# Altium footprint library General_Lib.PcbLib: 729 footprints (part 12 of 46)
Each footprint in its own frame and in the unit in brackets; x right, y up, seen from the top. Pads: shape width x height; smd on the part's side, far side on the other; paste and mask are expansions set on the pad; w line width, h text height; cw(c..) or ccw(c..) is an arc to the next point about the centre after c.
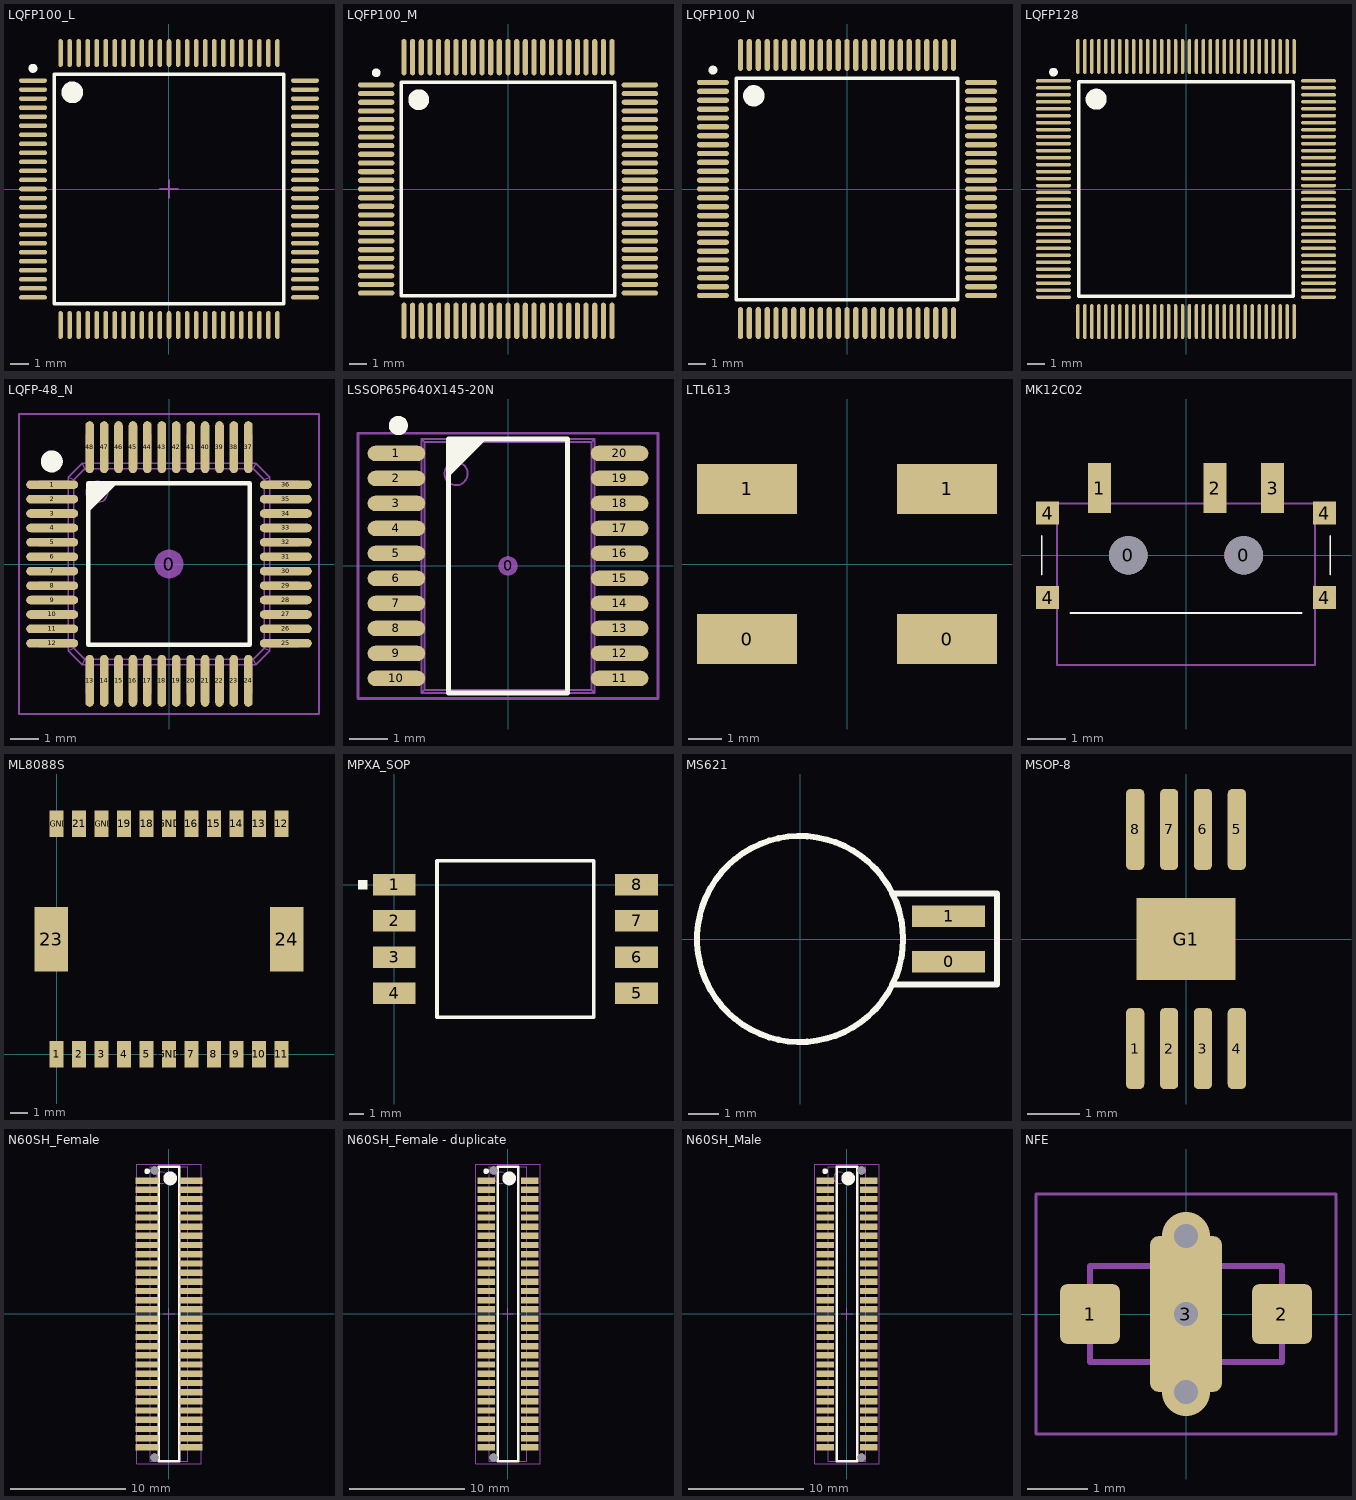
[diagram p11: the footprints below, top view; thin cyan lines are the x and y axes]

## LQFP100_L [mm] "Thin QFP, 100-Leads, Body 14x14mm, Pitch 0.5mm, IPC High Density"
height 1.6
pads (100):
  oval 1.55x0.25 smd: 1(-7.525,6) 2(-7.525,5.5) 3(-7.525,5) 4(-7.525,4.5) 5(-7.525,4) 6(-7.525,3.5) 7(-7.525,3) 8(-7.525,2.5) 9(-7.525,2) 10(-7.525,1.5) 11(-7.525,1) 12(-7.525,0.5) 13(-7.525,0) 14(-7.525,-0.5) 15(-7.525,-1) 16(-7.525,-1.5) 17(-7.525,-2) 18(-7.525,-2.5) 19(-7.525,-3) 20(-7.525,-3.5) 21(-7.525,-4) 22(-7.525,-4.5) 23(-7.525,-5) 24(-7.525,-5.5) 25(-7.525,-6) 51(7.525,-6) 52(7.525,-5.5) 53(7.525,-5) 54(7.525,-4.5) 55(7.525,-4) 56(7.525,-3.5) 57(7.525,-3) 58(7.525,-2.5) 59(7.525,-2) 60(7.525,-1.5) 61(7.525,-1) 62(7.525,-0.5) 63(7.525,0) 64(7.525,0.5) 65(7.525,1) 66(7.525,1.5) 67(7.525,2) 68(7.525,2.5) 69(7.525,3) 70(7.525,3.5) 71(7.525,4) 72(7.525,4.5) 73(7.525,5) 74(7.525,5.5) 75(7.525,6)
  oval 0.25x1.55 smd: 26(-6,-7.525) 27(-5.5,-7.525) 28(-5,-7.525) 29(-4.5,-7.525) 30(-4,-7.525) 31(-3.5,-7.525) 32(-3,-7.525) 33(-2.5,-7.525) 34(-2,-7.525) 35(-1.5,-7.525) 36(-1,-7.525) 37(-0.5,-7.525) 38(0,-7.525) 39(0.5,-7.525) 40(1,-7.525) 41(1.5,-7.525) 42(2,-7.525) 43(2.5,-7.525) 44(3,-7.525) 45(3.5,-7.525) 46(4,-7.525) 47(4.5,-7.525) 48(5,-7.525) 49(5.5,-7.525) 50(6,-7.525) 76(6,7.525) 77(5.5,7.525) 78(5,7.525) 79(4.5,7.525) 80(4,7.525) 81(3.5,7.525) 82(3,7.525) 83(2.5,7.525) 84(2,7.525) 85(1.5,7.525) 86(1,7.525) 87(0.5,7.525) 88(0,7.525) 89(-0.5,7.525) 90(-1,7.525) 91(-1.5,7.525) 92(-2,7.525) 93(-2.5,7.525) 94(-3,7.525) 95(-3.5,7.525) 96(-4,7.525) 97(-4.5,7.525) 98(-5,7.525) 99(-5.5,7.525) 100(-6,7.525)
Top Overlay:
  circle w0.25: c-7.525,6.675 r0.125
  circle w0.6: c-5.35,5.35 r0.3
  lines w0.2: -6.35,-6.35 -6.35,6.35 6.35,6.35 6.35,-6.35 -6.35,-6.35
Mechanical 15:
  lines w0.1: -0.5,0 0.5,0 ; 0,-0.5 0,0.5
3D body "LQFP-100.step": height 1.7, standoff -0.01, extent -8,-8 8,8

## LQFP100_M [mm] "Thin QFP, 100-Leads, Body 14x14mm, Pitch 0.5mm, IPC Low Density"
height 1.6
pads (100):
  oval 2.1x0.3 smd: 1(-7.6,6) 2(-7.6,5.5) 3(-7.6,5) 4(-7.6,4.5) 5(-7.6,4) 6(-7.6,3.5) 7(-7.6,3) 8(-7.6,2.5) 9(-7.6,2) 10(-7.6,1.5) 11(-7.6,1) 12(-7.6,0.5) 13(-7.6,0) 14(-7.6,-0.5) 15(-7.6,-1) 16(-7.6,-1.5) 17(-7.6,-2) 18(-7.6,-2.5) 19(-7.6,-3) 20(-7.6,-3.5) 21(-7.6,-4) 22(-7.6,-4.5) 23(-7.6,-5) 24(-7.6,-5.5) 25(-7.6,-6) 51(7.6,-6) 52(7.6,-5.5) 53(7.6,-5) 54(7.6,-4.5) 55(7.6,-4) 56(7.6,-3.5) 57(7.6,-3) 58(7.6,-2.5) 59(7.6,-2) 60(7.6,-1.5) 61(7.6,-1) 62(7.6,-0.5) 63(7.6,0) 64(7.6,0.5) 65(7.6,1) 66(7.6,1.5) 67(7.6,2) 68(7.6,2.5) 69(7.6,3) 70(7.6,3.5) 71(7.6,4) 72(7.6,4.5) 73(7.6,5) 74(7.6,5.5) 75(7.6,6)
  oval 0.3x2.1 smd: 26(-6,-7.6) 27(-5.5,-7.6) 28(-5,-7.6) 29(-4.5,-7.6) 30(-4,-7.6) 31(-3.5,-7.6) 32(-3,-7.6) 33(-2.5,-7.6) 34(-2,-7.6) 35(-1.5,-7.6) 36(-1,-7.6) 37(-0.5,-7.6) 38(0,-7.6) 39(0.5,-7.6) 40(1,-7.6) 41(1.5,-7.6) 42(2,-7.6) 43(2.5,-7.6) 44(3,-7.6) 45(3.5,-7.6) 46(4,-7.6) 47(4.5,-7.6) 48(5,-7.6) 49(5.5,-7.6) 50(6,-7.6) 76(6,7.6) 77(5.5,7.6) 78(5,7.6) 79(4.5,7.6) 80(4,7.6) 81(3.5,7.6) 82(3,7.6) 83(2.5,7.6) 84(2,7.6) 85(1.5,7.6) 86(1,7.6) 87(0.5,7.6) 88(0,7.6) 89(-0.5,7.6) 90(-1,7.6) 91(-1.5,7.6) 92(-2,7.6) 93(-2.5,7.6) 94(-3,7.6) 95(-3.5,7.6) 96(-4,7.6) 97(-4.5,7.6) 98(-5,7.6) 99(-5.5,7.6) 100(-6,7.6)
Top Overlay:
  circle w0.25: c-7.6,6.7 r0.125
  circle w0.6: c-5.15,5.15 r0.3
  lines w0.2: -6.15,-6.15 -6.15,6.15 6.15,6.15 6.15,-6.15 -6.15,-6.15
3D body "LQFP-100.step": height 1.7, standoff -0.01, extent -8,-8 8,8

## LQFP100_N [mm] "Thin QFP, 100-Leads, Body 14x14mm, Pitch 0.5mm, IPC Medium Density"
height 1.6
pads (100):
  oval 1.8x0.3 smd: 1(-7.55,6) 2(-7.55,5.5) 3(-7.55,5) 4(-7.55,4.5) 5(-7.55,4) 6(-7.55,3.5) 7(-7.55,3) 8(-7.55,2.5) 9(-7.55,2) 10(-7.55,1.5) 11(-7.55,1) 12(-7.55,0.5) 13(-7.55,0) 14(-7.55,-0.5) 15(-7.55,-1) 16(-7.55,-1.5) 17(-7.55,-2) 18(-7.55,-2.5) 19(-7.55,-3) 20(-7.55,-3.5) 21(-7.55,-4) 22(-7.55,-4.5) 23(-7.55,-5) 24(-7.55,-5.5) 25(-7.55,-6) 51(7.55,-6) 52(7.55,-5.5) 53(7.55,-5) 54(7.55,-4.5) 55(7.55,-4) 56(7.55,-3.5) 57(7.55,-3) 58(7.55,-2.5) 59(7.55,-2) 60(7.55,-1.5) 61(7.55,-1) 62(7.55,-0.5) 63(7.55,0) 64(7.55,0.5) 65(7.55,1) 66(7.55,1.5) 67(7.55,2) 68(7.55,2.5) 69(7.55,3) 70(7.55,3.5) 71(7.55,4) 72(7.55,4.5) 73(7.55,5) 74(7.55,5.5) 75(7.55,6)
  oval 0.3x1.8 smd: 26(-6,-7.55) 27(-5.5,-7.55) 28(-5,-7.55) 29(-4.5,-7.55) 30(-4,-7.55) 31(-3.5,-7.55) 32(-3,-7.55) 33(-2.5,-7.55) 34(-2,-7.55) 35(-1.5,-7.55) 36(-1,-7.55) 37(-0.5,-7.55) 38(0,-7.55) 39(0.5,-7.55) 40(1,-7.55) 41(1.5,-7.55) 42(2,-7.55) 43(2.5,-7.55) 44(3,-7.55) 45(3.5,-7.55) 46(4,-7.55) 47(4.5,-7.55) 48(5,-7.55) 49(5.5,-7.55) 50(6,-7.55) 76(6,7.55) 77(5.5,7.55) 78(5,7.55) 79(4.5,7.55) 80(4,7.55) 81(3.5,7.55) 82(3,7.55) 83(2.5,7.55) 84(2,7.55) 85(1.5,7.55) 86(1,7.55) 87(0.5,7.55) 88(0,7.55) 89(-0.5,7.55) 90(-1,7.55) 91(-1.5,7.55) 92(-2,7.55) 93(-2.5,7.55) 94(-3,7.55) 95(-3.5,7.55) 96(-4,7.55) 97(-4.5,7.55) 98(-5,7.55) 99(-5.5,7.55) 100(-6,7.55)
Top Overlay:
  circle w0.25: c-7.55,6.7 r0.125
  circle w0.6: c-5.25,5.25 r0.3
  lines w0.2: -6.25,-6.25 -6.25,6.25 6.25,6.25 6.25,-6.25 -6.25,-6.25
3D body "LQFP-100.step": height 1.7, standoff -0.01, extent -8,-8 8,8

## LQFP128 [mm] "Thin QFP, 128Leads, Body 14x14mm, Pitch 0.4mm, IPC Low Density"
height 1.6
pads (128):
  oval 2x0.2 smd: 1(-7.6,6.2) 2(-7.6,5.8) 3(-7.6,5.4) 4(-7.6,5) 5(-7.6,4.6) 6(-7.6,4.2) 7(-7.6,3.8) 8(-7.6,3.4) 9(-7.6,3) 10(-7.6,2.6) 11(-7.6,2.2) 12(-7.6,1.8) 13(-7.6,1.4) 14(-7.6,1) 15(-7.6,0.6) 16(-7.6,0.2) 17(-7.6,-0.2) 18(-7.6,-0.6) 19(-7.6,-1) 20(-7.6,-1.4) 21(-7.6,-1.8) 22(-7.6,-2.2) 23(-7.6,-2.6) 24(-7.6,-3) 25(-7.6,-3.4) 26(-7.6,-3.8) 27(-7.6,-4.2) 28(-7.6,-4.6) 29(-7.6,-5) 30(-7.6,-5.4) 31(-7.6,-5.8) 32(-7.6,-6.2) 65(7.6,-6.2) 66(7.6,-5.8) 67(7.6,-5.4) 68(7.6,-5) 69(7.6,-4.6) 70(7.6,-4.2) 71(7.6,-3.8) 72(7.6,-3.4) 73(7.6,-3) 74(7.6,-2.6) 75(7.6,-2.2) 76(7.6,-1.8) 77(7.6,-1.4) 78(7.6,-1) 79(7.6,-0.6) 80(7.6,-0.2) 81(7.6,0.2) 82(7.6,0.6) 83(7.6,1) 84(7.6,1.4) 85(7.6,1.8) 86(7.6,2.2) 87(7.6,2.6) 88(7.6,3) 89(7.6,3.4) 90(7.6,3.8) 91(7.6,4.2) 92(7.6,4.6) 93(7.6,5) 94(7.6,5.4) 95(7.6,5.8) 96(7.6,6.2)
  oval 0.2x2 smd: 33(-6.2,-7.6) 34(-5.8,-7.6) 35(-5.4,-7.6) 36(-5,-7.6) 37(-4.6,-7.6) 38(-4.2,-7.6) 39(-3.8,-7.6) 40(-3.4,-7.6) 41(-3,-7.6) 42(-2.6,-7.6) 43(-2.2,-7.6) 44(-1.8,-7.6) 45(-1.4,-7.6) 46(-1,-7.6) 47(-0.6,-7.6) 48(-0.2,-7.6) 49(0.2,-7.6) 50(0.6,-7.6) 51(1,-7.6) 52(1.4,-7.6) 53(1.8,-7.6) 54(2.2,-7.6) 55(2.6,-7.6) 56(3,-7.6) 57(3.4,-7.6) 58(3.8,-7.6) 59(4.2,-7.6) 60(4.6,-7.6) 61(5,-7.6) 62(5.4,-7.6) 63(5.8,-7.6) 64(6.2,-7.6) 97(6.2,7.6) 98(5.8,7.6) 99(5.4,7.6) 100(5,7.6) 101(4.6,7.6) 102(4.2,7.6) 103(3.8,7.6) 104(3.4,7.6) 105(3,7.6) 106(2.6,7.6) 107(2.2,7.6) 108(1.8,7.6) 109(1.4,7.6) 110(1,7.6) 111(0.6,7.6) 112(0.2,7.6) 113(-0.2,7.6) 114(-0.6,7.6) 115(-1,7.6) 116(-1.4,7.6) 117(-1.8,7.6) 118(-2.2,7.6) 119(-2.6,7.6) 120(-3,7.6) 121(-3.4,7.6) 122(-3.8,7.6) 123(-4.2,7.6) 124(-4.6,7.6) 125(-5,7.6) 126(-5.4,7.6) 127(-5.8,7.6) 128(-6.2,7.6)
Top Overlay:
  circle w0.6: c-5.15,5.15 r0.3
  circle w0.25: c-7.6,6.7 r0.125
  lines w0.2: -6.15,-6.15 6.15,-6.15 6.15,6.15 -6.15,6.15 -6.15,-6.15
3D body "LQFP-128.step": height 1.35, standoff 0, extent -8,-8 8,8

## LQFP-48_N [mm] "Thin QFP, 48-Leads, Body 7x7mm, Pitch 0.5mm, IPC Medium Density"
height 1.6
pads (49):
  round 1 on Mech15: 0(0,0)
  oval 1.8x0.3 smd: 1(-4.05,2.75) 2(-4.05,2.25) 3(-4.05,1.75) 4(-4.05,1.25) 5(-4.05,0.75) 6(-4.05,0.25) 7(-4.05,-0.25) 8(-4.05,-0.75) 9(-4.05,-1.25) 10(-4.05,-1.75) 11(-4.05,-2.25) 12(-4.05,-2.75) 25(4.05,-2.75) 26(4.05,-2.25) 27(4.05,-1.75) 28(4.05,-1.25) 29(4.05,-0.75) 30(4.05,-0.25) 31(4.05,0.25) 32(4.05,0.75) 33(4.05,1.25) 34(4.05,1.75) 35(4.05,2.25) 36(4.05,2.75)
  oval 0.3x1.8 smd: 13(-2.75,-4.05) 14(-2.25,-4.05) 15(-1.75,-4.05) 16(-1.25,-4.05) 17(-0.75,-4.05) 18(-0.25,-4.05) 19(0.25,-4.05) 20(0.75,-4.05) 21(1.25,-4.05) 22(1.75,-4.05) 23(2.25,-4.05) 24(2.75,-4.05) 37(2.75,4.05) 38(2.25,4.05) 39(1.75,4.05) 40(1.25,4.05) 41(0.75,4.05) 42(0.25,4.05) 43(-0.25,4.05) 44(-0.75,4.05) 45(-1.25,4.05) 46(-1.75,4.05) 47(-2.25,4.05) 48(-2.75,4.05)
Top Overlay:
  circle w0.381: c-4.064,3.556 r0.191
  region: -2.794,2.794 -1.794,2.794 -2.794,1.794
  lines w0.152: -2.794,-2.794 -2.794,2.794 2.794,2.794 2.794,-2.794 -2.794,-2.794
Mechanical 13:
  drawing of 361 lines, arcs and shapes, not listed
Mechanical 15:
  lines w0.076: -5.2,-5.2 -5.2,5.2 5.2,5.2 5.2,-5.2 -5.2,-5.2
3D body "LQFP-48.STEP": height 1.59, standoff -0.01, extent -4.5,-4.5 4.5,4.5

## LSSOP65P640X145-20N [mm] "LSSOP, 20-Leads, Body 6.6x4.5mm (max), Pitch 0.65mm, IPC Medium Density"
height 1.45
pads (21):
  round 0.508 on Mech15 mask+0.127: 0(0,0)
  oval 1.5x0.4 smd paste-1 mask+0.127: 1(-2.9,2.925) 2(-2.9,2.275) 3(-2.9,1.625) 4(-2.9,0.975) 5(-2.9,0.325) 6(-2.9,-0.325) 7(-2.9,-0.975) 8(-2.9,-1.625) 9(-2.9,-2.275) 10(-2.9,-2.925) 11(2.9,-2.925) 12(2.9,-2.275) 13(2.9,-1.625) 14(2.9,-0.975) 15(2.9,-0.325) 16(2.9,0.325) 17(2.9,0.975) 18(2.9,1.625) 19(2.9,2.275) 20(2.9,2.925)
Top Overlay:
  circle w0.25: c-2.85,3.65 r0.125
  region: -1.55,3.3 -0.55,3.3 -1.55,2.3
  lines w0.127: -1.55,-3.3 1.55,-3.3 1.55,3.3 -1.55,3.3 -1.55,-3.3
Top Paste:
  region: 3.5,-2.775 2.3,-2.775 2.3,-3.075 3.5,-3.075
  region: 3.5,-2.125 2.3,-2.125 2.3,-2.425 3.5,-2.425
  region: 3.5,-1.475 2.3,-1.475 2.3,-1.775 3.5,-1.775
  rectangle: -3.5,-1.775 -2.3,-1.475
  rectangle: -3.5,-2.425 -2.3,-2.125
  rectangle: -3.5,-3.075 -2.3,-2.775
  rectangle: -3.5,-1.125 -2.3,-0.825
  rectangle: -3.5,-0.475 -2.3,-0.175
  rectangle: -3.5,0.175 -2.3,0.475
  rectangle: -3.5,0.825 -2.3,1.125
  rectangle: -3.5,1.475 -2.3,1.775
  rectangle: -3.5,2.125 -2.3,2.425
  rectangle: -3.5,2.775 -2.3,3.075
  region: 3.5,3.075 2.3,3.075 2.3,2.775 3.5,2.775
  region: 3.5,2.425 2.3,2.425 2.3,2.125 3.5,2.125
  region: 3.5,1.775 2.3,1.775 2.3,1.475 3.5,1.475
  region: 3.5,1.125 2.3,1.125 2.3,0.825 3.5,0.825
  region: 3.5,0.475 2.3,0.475 2.3,0.175 3.5,0.175
  region: 3.5,-0.175 2.3,-0.175 2.3,-0.475 3.5,-0.475
  region: 3.5,-0.825 2.3,-0.825 2.3,-1.125 3.5,-1.125
Mechanical 13:
  drawing of 153 lines, arcs and shapes, not listed
Mechanical 15:
  lines w0.076: -3.9,-3.45 3.9,-3.45 3.9,3.45 -3.9,3.45 -3.9,-3.45
3D body "LSSOP65P640X145-20N.STEP": height 1.45, standoff 0, extent -3.3,-3.3 3.3,3.3

## LTL613 [mm]
pads (4):
  rect 3x1.5 smd: 0(-3,-2.25) 0(3,-2.25) 1(-3,2.25) 1(3,2.25)
3D body "LTL613.stp": height 5, standoff 0, extent -4.039,-3 4.039,3

## MK12C02 [mm]
pads (9):
  round 1 hole 1 unplated: 0(-1.5,0) 0(1.5,0)
  rect 0.6x1.3 smd: 1(-2.25,1.75) 2(0.75,1.75) 3(2.25,1.75)
  rect 0.6x0.6 smd: 4(-3.6,-1.1) 4(-3.6,1.1) 4(3.6,-1.1) 4(3.6,1.1)
Top Overlay:
  lines w0.05: -3.75,-0.5 -3.75,0.5 ; -3,-1.5 3,-1.5 ; 3.75,-0.5 3.75,0.5
Mechanical 3:
  lines w0.05: -3.35,-2.85 3.35,-2.85 3.35,1.35 -3.35,1.35 -3.35,-2.85

## ML8088S [mm]
pads (24):
  rect 0.8x1.5 smd: 1(0,0) 2(1.27,0) 3(2.54,0) 4(3.81,0) 5(5.08,0) 7(7.62,0) 8(8.89,0) 9(10.16,0) 10(11.43,0) 11(12.7,0) 12(12.7,13) 13(11.43,13) 14(10.16,13) 15(8.89,13) 16(7.62,13) 18(5.08,13) 19(3.81,13) 21(1.27,13) AGND(0,13) AGND(2.54,13) GND(6.35,0) GND(6.35,13)
  rect 1.9x3.65 smd: 23(-0.3,6.495) 24(13,6.495)
3D body "ML8088S.stp": height 2.85, standoff 0, extent -1.15,0 13.85,13

## MPXA_SOP [mm]
pads (8):
  rect 3x1.5 smd: 1(0,0) 2(0,-2.54) 3(0,-5.08) 4(0,-7.62) 5(17,-7.62) 6(17,-5.08) 7(17,-2.54) 8(17,0)
Top Overlay:
  region: -2.54,-0.318 -1.905,-0.318 -1.905,0.318 -2.54,0.318
  lines w0.254: 3,-9.31 14,-9.31 14,1.69 3,1.69 3,-9.31
3D body "humidity sensor.stp": height 5.82, standoff -0.03, extent -0.963,-9.15 17.813,1.55

## MS621 [mm] "Micro Li-ion rechargable battery"
pads (2):
  rect 2.4x0.7 smd: 0(4.9,-0.75) 1(4.9,0.75)
Top Overlay:
  circle w0.2: c0,0 r3.4
  lines w0.2: 3.1,-1.5 6.5,-1.5 6.5,1.5 3.1,1.5
3D body "MS621_batt.stp": height 2.4, standoff 0, extent -3.4,-3.4 5.9,3.4

## MSOP-8 [mm]
pads (9):
  rrect50% 0.35x1.55 smd: 1(-0.975,-2.1) 2(-0.325,-2.1) 3(0.325,-2.1) 4(0.975,-2.1) 5(0.975,2.1) 6(0.325,2.1) 7(-0.325,2.1) 8(-0.975,2.1)
  rect 1.89x1.57 smd: G1(0,0)
3D body "MSOP-8.step": height 1.09, standoff -0.01, extent -1.5,-2.5 1.5,2.5

## N60SH_Female [mm] "Netus, 60-Leads, Body 25,6x3,3mm (max), Pitch 0,80mm, IPC Medium Density"
height 3.55
pads (60):
  rect 2x0.55 smd: 1(-1.9,11.6) 2(1.9,11.6) 3(-1.9,10.8) 4(1.9,10.8) 5(-1.9,10) 6(1.9,10) 7(-1.9,9.2) 8(1.9,9.2) 9(-1.9,8.4) 10(1.9,8.4) 11(-1.9,7.6) 12(1.9,7.6) 13(-1.9,6.8) 14(1.9,6.8) 15(-1.9,6) 16(1.9,6) 17(-1.9,5.2) 18(1.9,5.2) 19(-1.9,4.4) 20(1.9,4.4) 21(-1.9,3.6) 22(1.9,3.6) 23(-1.9,2.8) 24(1.9,2.8) 25(-1.9,2) 26(1.9,2) 27(-1.9,1.2) 28(1.9,1.2) 29(-1.9,0.4) 30(1.9,0.4) 31(-1.9,-0.4) 32(1.9,-0.4) 33(-1.9,-1.2) 34(1.9,-1.2) 35(-1.9,-2) 36(1.9,-2) 37(-1.9,-2.8) 38(1.9,-2.8) 39(-1.9,-3.6) 40(1.9,-3.6) 41(-1.9,-4.4) 42(1.9,-4.4) 43(-1.9,-5.2) 44(1.9,-5.2) 45(-1.9,-6) 46(1.9,-6) 47(-1.9,-6.8) 48(1.9,-6.8) 49(-1.9,-7.6) 50(1.9,-7.6) 51(-1.9,-8.4) 52(1.9,-8.4) 53(-1.9,-9.2) 54(1.9,-9.2) 55(-1.9,-10) 56(1.9,-10) 57(-1.9,-10.8) 58(1.9,-10.8) 59(-1.9,-11.6) 60(1.9,-11.6)
via -1.25,12.5 diameter 0.7 hole 0.7
via -1.25,-12.5 diameter 0.7 hole 0.7
Top Overlay:
  circle w0.25: c-1.9,12.425 r0.125
  circle w0.6: c0.1,11.8 r0.3
  lines w0.2: -0.9,-12.8 -0.9,12.8 0.9,12.8 0.9,-12.8 -0.9,-12.8
Mechanical 13:
  circle w0.1: c-0.675,11.85 r0.5
  lines w0.1: -1.625,-12.8 -1.625,12.8 1.625,12.8 1.625,-12.8 -1.625,-12.8
Mechanical 15:
  lines w0.1: -0.5,0 0.5,0 ; 0,-0.5 0,0.5 ; -2.8,-13.05 -2.8,13.05 2.8,13.05 2.8,-13.05 -2.8,-13.05
3D body: height 3.55, standoff 0.1, extent -1.625,-12.8 1.625,12.8

## N60SH_Female - duplicate [mm] "Netus, 60-Leads, Body 25,6x3,3mm (max), Pitch 0,80mm, IPC Medium Density"
height 3.55
pads (60):
  rect 1.5x0.55 smd: 1(-1.9,11.6) 2(1.9,11.6) 3(-1.9,10.8) 4(1.9,10.8) 5(-1.9,10) 6(1.9,10) 7(-1.9,9.2) 8(1.9,9.2) 9(-1.9,8.4) 10(1.9,8.4) 11(-1.9,7.6) 12(1.9,7.6) 13(-1.9,6.8) 14(1.9,6.8) 15(-1.9,6) 16(1.9,6) 17(-1.9,5.2) 18(1.9,5.2) 19(-1.9,4.4) 20(1.9,4.4) 21(-1.9,3.6) 22(1.9,3.6) 23(-1.9,2.8) 24(1.9,2.8) 25(-1.9,2) 26(1.9,2) 27(-1.9,1.2) 28(1.9,1.2) 29(-1.9,0.4) 30(1.9,0.4) 31(-1.9,-0.4) 32(1.9,-0.4) 33(-1.9,-1.2) 34(1.9,-1.2) 35(-1.9,-2) 36(1.9,-2) 37(-1.9,-2.8) 38(1.9,-2.8) 39(-1.9,-3.6) 40(1.9,-3.6) 41(-1.9,-4.4) 42(1.9,-4.4) 43(-1.9,-5.2) 44(1.9,-5.2) 45(-1.9,-6) 46(1.9,-6) 47(-1.9,-6.8) 48(1.9,-6.8) 49(-1.9,-7.6) 50(1.9,-7.6) 51(-1.9,-8.4) 52(1.9,-8.4) 53(-1.9,-9.2) 54(1.9,-9.2) 55(-1.9,-10) 56(1.9,-10) 57(-1.9,-10.8) 58(1.9,-10.8) 59(-1.9,-11.6) 60(1.9,-11.6)
via -1.25,12.5 diameter 0.7 hole 0.7
via -1.25,-12.5 diameter 0.7 hole 0.7
Top Overlay:
  circle w0.25: c-1.9,12.425 r0.125
  circle w0.6: c0.1,11.8 r0.3
  lines w0.2: -0.9,-12.8 -0.9,12.8 0.9,12.8 0.9,-12.8 -0.9,-12.8
Mechanical 13:
  circle w0.1: c-0.675,11.85 r0.5
  lines w0.1: -1.625,-12.8 -1.625,12.8 1.625,12.8 1.625,-12.8 -1.625,-12.8
Mechanical 15:
  lines w0.1: -0.5,0 0.5,0 ; 0,-0.5 0,0.5 ; -2.8,-13.05 -2.8,13.05 2.8,13.05 2.8,-13.05 -2.8,-13.05
3D body: height 3.55, standoff 0.1, extent -1.625,-12.8 1.625,12.8

## N60SH_Male [mm] "Netus, 60-Leads, Body 25,6x3,3mm (max), Pitch 0,80mm, IPC Medium Density"
height 3.55
pads (60):
  rect 1.5x0.55 smd: 1(-1.9,11.6) 2(1.9,11.6) 3(-1.9,10.8) 4(1.9,10.8) 5(-1.9,10) 6(1.9,10) 7(-1.9,9.2) 8(1.9,9.2) 9(-1.9,8.4) 10(1.9,8.4) 11(-1.9,7.6) 12(1.9,7.6) 13(-1.9,6.8) 14(1.9,6.8) 15(-1.9,6) 16(1.9,6) 17(-1.9,5.2) 18(1.9,5.2) 19(-1.9,4.4) 20(1.9,4.4) 21(-1.9,3.6) 22(1.9,3.6) 23(-1.9,2.8) 24(1.9,2.8) 25(-1.9,2) 26(1.9,2) 27(-1.9,1.2) 28(1.9,1.2) 29(-1.9,0.4) 30(1.9,0.4) 31(-1.9,-0.4) 32(1.9,-0.4) 33(-1.9,-1.2) 34(1.9,-1.2) 35(-1.9,-2) 36(1.9,-2) 37(-1.9,-2.8) 38(1.9,-2.8) 39(-1.9,-3.6) 40(1.9,-3.6) 41(-1.9,-4.4) 42(1.9,-4.4) 43(-1.9,-5.2) 44(1.9,-5.2) 45(-1.9,-6) 46(1.9,-6) 47(-1.9,-6.8) 48(1.9,-6.8) 49(-1.9,-7.6) 50(1.9,-7.6) 51(-1.9,-8.4) 52(1.9,-8.4) 53(-1.9,-9.2) 54(1.9,-9.2) 55(-1.9,-10) 56(1.9,-10) 57(-1.9,-10.8) 58(1.9,-10.8) 59(-1.9,-11.6) 60(1.9,-11.6)
via 1.25,-12.5 diameter 0.7 hole 0.7
via 1.25,12.5 diameter 0.7 hole 0.7
Top Overlay:
  circle w0.25: c-1.9,12.425 r0.125
  circle w0.6: c0.1,11.8 r0.3
  lines w0.2: -0.9,-12.8 -0.9,12.8 0.9,12.8 0.9,-12.8 -0.9,-12.8
Mechanical 13:
  circle w0.1: c-0.675,11.85 r0.5
  lines w0.1: -1.625,-12.8 -1.625,12.8 1.625,12.8 1.625,-12.8 -1.625,-12.8
Mechanical 15:
  lines w0.1: -0.5,0 0.5,0 ; 0,-0.5 0,0.5 ; -2.8,-13.05 -2.8,13.05 2.8,13.05 2.8,-13.05 -2.8,-13.05
3D body: height 3.55, standoff 0.1, extent -1.625,-12.8 1.625,12.8

## NFE [mm] "Chip LC 3-Leads, Body 3,20x1,60mm, IPC Medium Density"
height 1.6
pads (3):
  rrect25% 1x1 smd: 1(-1.6,0) 2(1.6,0)
  rrect25% 1.2x2.6 smd: 3(0,0)
via 0,-1.3 diameter 0.8 hole 0.4
via 0,1.3 diameter 0.8 hole 0.4
via 0,0 diameter 0.8 hole 0.4
Mechanical 13:
  lines w0.1: -1.6,-0.8 -1.6,0.8 1.6,0.8 1.6,-0.8 -1.6,-0.8
Mechanical 15:
  lines w0.05: -2.5,-2 -2.5,2 2.5,2 2.5,-2 -2.5,-2
  lines w0.1: -0.5,0 0.5,0 ; 0,-0.5 0,0.5
3D body "User Library-Murata_NFE31P.STEP": height 1.6, standoff 0, extent -1.587,-0.8 1.613,0.8